# Altium footprint library OT Library.PcbLib: 396 footprints (part 23 of 25)
Each footprint in its own frame and in the unit in brackets; x right, y up, seen from the top. Pads: shape width x height; smd on the part's side, far side on the other; paste and mask are expansions set on the pad; w line width, h text height; cw(c..) or ccw(c..) is an arc to the next point about the centre after c.
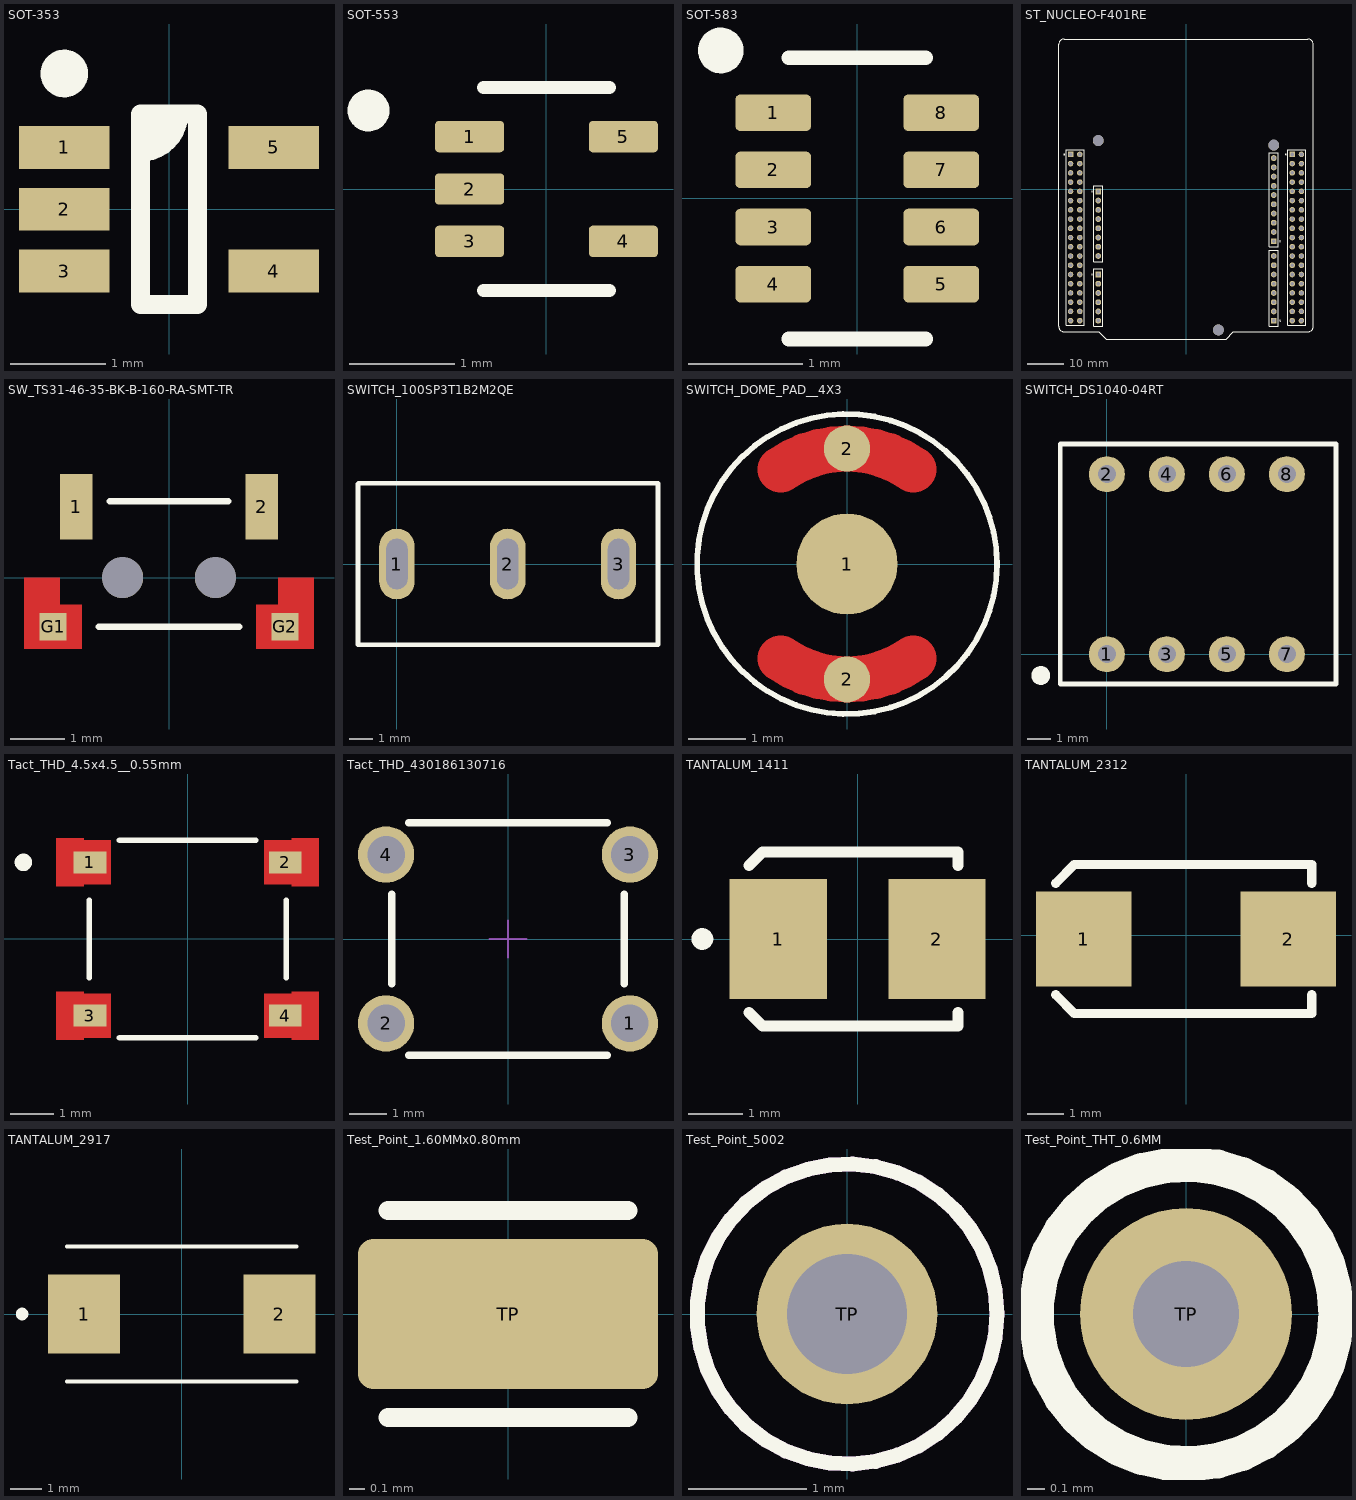
[diagram p22: the footprints below, top view; thin cyan lines are the x and y axes]

## SOT-353 [mm] "5-TSSOP, SC-70-5"
height 1.1
pads (5):
  rect 0.95x0.45 smd: 1(-1.1,0.65) 2(-1.1,0) 3(-1.1,-0.65) 4(1.1,-0.65) 5(1.1,0.65)
Top Overlay:
  circle w0.25: c-1.1,1.425 r0.125
  region: -0.3,1 -0.3,0.592 -0.144,0.623 -0.012,0.712 0.077,0.844 0.108,1 0.1,1
  lines w0.2: -0.3,0.6 ccw(c-0.3,1) 0.1,1 ; -0.3,-1 0.3,-1 0.3,1 -0.3,1 -0.3,-1
3D body: height 1.1, standoff 0, extent -1.06,-1 1.061,1

## SOT-553 [mm]
pads (5):
  rrect25% 0.66x0.3 smd: 1(-0.735,0.5) 2(-0.735,0) 3(-0.735,-0.5) 4(0.735,-0.5) 5(0.735,0.5)
Top Overlay:
  circle w0.2: c-1.7,0.75 r0.1
  lines w0.127: -0.6,-0.97 0.6,-0.97 ; -0.6,0.97 0.6,0.97
3D body: height 0.6, standoff 0, extent -0.8,-0.8 0.8,0.8

## SOT-583 [mm]
height 0.6
pads (8):
  rrect25% 0.66x0.32 smd mask+0: 1(-0.735,0.75) 2(-0.735,0.25) 3(-0.735,-0.25) 4(-0.735,-0.75) 5(0.735,-0.75) 6(0.735,-0.25) 7(0.735,0.25) 8(0.735,0.75)
Top Overlay:
  circle w0.2: c-1.194,1.295 r0.1
  lines w0.127: -0.6,-1.23 0.6,-1.23 ; -0.6,1.23 0.6,1.23
Top Solder:
  region: 1.115,0.54 0.355,0.54 0.355,0.96 1.115,0.96
  region: 1.115,0.04 0.355,0.04 0.355,0.46 1.115,0.46
  region: 1.115,-0.46 0.355,-0.46 0.355,-0.04 1.115,-0.04
  region: 1.115,-0.96 0.355,-0.96 0.355,-0.54 1.115,-0.54
  region: -0.355,-0.96 -1.115,-0.96 -1.115,-0.54 -0.355,-0.54
  region: -0.355,-0.46 -1.115,-0.46 -1.115,-0.04 -0.355,-0.04
  region: -0.355,0.04 -1.115,0.04 -1.115,0.46 -0.355,0.46
  region: -0.355,0.54 -1.115,0.54 -1.115,0.96 -0.355,0.96
3D body: height 0.6, standoff 0, extent -0.8,-1.05 0.8,1.05

## ST_NUCLEO-F401RE [mm]
pads (111):
  rect 1.605x1.605 / inner round 1.605 / far side rect 1.605x1.605 hole 1.07: 5_1(24.13,-14.37) 6_1(-24.13,-0.65) 8_1(-24.13,-23.51) 9_1(24.13,-36.21)
  round 1.605 hole 1.07: 5_2(24.13,-11.83) 5_3(24.13,-9.29) 5_4(24.13,-6.75) 5_5(24.13,-4.21) 5_6(24.13,-1.67) 5_7(24.13,0.87) 5_8(24.13,3.41) 5_9(24.13,5.95) 5_10(24.13,8.49) 6_2(-24.13,-3.19) 6_3(-24.13,-5.73) 6_4(-24.13,-8.27) 6_5(-24.13,-10.81) 6_6(-24.13,-13.35) 6_7(-24.13,-15.89) 6_8(-24.13,-18.43) 8_2(-24.13,-26.05) 8_3(-24.13,-28.59) 8_4(-24.13,-31.13) 8_5(-24.13,-33.67) 8_6(-24.13,-36.21) 9_2(24.13,-33.67) 9_3(24.13,-31.13) 9_4(24.13,-28.59) 9_5(24.13,-26.05) 9_6(24.13,-23.51) 9_7(24.13,-20.97) 9_8(24.13,-18.43)
  rect 1.53x1.53 / inner round 1.53 / far side rect 1.53x1.53 hole 1.02: 7_1(-31.75,9.51) 10_1(29.21,9.51)
  round 1.53 hole 1.02: 7_2(-29.21,9.51) 7_3(-31.75,6.97) 7_4(-29.21,6.97) 7_5(-31.75,4.43) 7_6(-29.21,4.43) 7_7(-31.75,1.89) 7_8(-29.21,1.89) 7_9(-31.75,-0.65) 7_10(-29.21,-0.65) 7_11(-31.75,-3.19) 7_12(-29.21,-3.19) 7_13(-31.75,-5.73) 7_14(-29.21,-5.73) 7_15(-31.75,-8.27) 7_16(-29.21,-8.27) 7_17(-31.75,-10.81) 7_18(-29.21,-10.81) 7_19(-31.75,-13.35) 7_20(-29.21,-13.35) 7_21(-31.75,-15.89) 7_22(-29.21,-15.89) 7_23(-31.75,-18.43) 7_24(-29.21,-18.43) 7_25(-31.75,-20.97) 7_26(-29.21,-20.97) 7_27(-31.75,-23.51) 7_28(-29.21,-23.51) 7_29(-31.75,-26.05) 7_30(-29.21,-26.05) 7_31(-31.75,-28.59) 7_32(-29.21,-28.59) 7_33(-31.75,-31.13) 7_34(-29.21,-31.13) 7_35(-31.75,-33.67) 7_36(-29.21,-33.67) 7_37(-31.75,-36.21) 7_38(-29.21,-36.21) 10_2(31.75,9.51) 10_3(29.21,6.97) 10_4(31.75,6.97) 10_5(29.21,4.43) 10_6(31.75,4.43) 10_7(29.21,1.89) 10_8(31.75,1.89) 10_9(29.21,-0.65) 10_10(31.75,-0.65) 10_11(29.21,-3.19) 10_12(31.75,-3.19) 10_13(29.21,-5.73) 10_14(31.75,-5.73) 10_15(29.21,-8.27) 10_16(31.75,-8.27) 10_17(29.21,-10.81) 10_18(31.75,-10.81) 10_19(29.21,-13.35) 10_20(31.75,-13.35) 10_21(29.21,-15.89) 10_22(31.75,-15.89) 10_23(29.21,-18.43) 10_24(31.75,-18.43) 10_25(29.21,-20.97) 10_26(31.75,-20.97) 10_27(29.21,-23.51) 10_28(31.75,-23.51) 10_29(29.21,-26.05) 10_30(31.75,-26.05) 10_31(29.21,-28.59) 10_32(31.75,-28.59) 10_33(29.21,-31.13) 10_34(31.75,-31.13) 10_35(29.21,-33.67) 10_36(31.75,-33.67) 10_37(29.21,-36.21) 10_38(31.75,-36.21)
  round 3 hole 3 unplated: ""(-24.13,13.32) ""(8.89,-38.75) ""(24.13,12.05)
Top Overlay:
  circle w0.2: c27.46,9.51 r0.1
  circle w0.2: c-33.5,9.51 r0.1
  circle w0.2: c25.88,-14.37 r0.1
  circle w0.2: c-25.88,-23.51 r0.1
  circle w0.2: c25.88,-36.21 r0.1
  circle w0.2: c-25.88,-0.65 r0.1
  lines w0.127: -35,-37.75 ccw(c-33.5,-37.75) -33.5,-39.25 -24,-39.25 -22,-41.25 11,-41.25 13,-39.25 33.5,-39.25 ccw(c33.5,-37.75) 35,-37.75 35,39.75 ccw(c33.5,39.75) 33.5,41.25 -33.5,41.25 ccw(c-33.5,39.75) -35,39.75 -35,-37.75 ; -32.98,-37.48 -27.98,-37.48 -27.98,10.78 -32.98,10.78 -32.98,-37.48 ; -25.38,-37.73 -22.88,-37.73 -22.88,-21.99 -25.38,-21.99 -25.38,-37.73 ; -25.38,-19.95 -22.88,-19.95 -22.88,0.87 -25.38,0.87 -25.38,-19.95 ; 22.88,-37.73 25.38,-37.73 25.38,-16.91 22.88,-16.91 22.88,-37.73 ; 22.88,-15.89 25.38,-15.89 25.38,10.01 22.88,10.01 22.88,-15.89 ; 27.98,-37.48 32.98,-37.48 32.98,10.78 27.98,10.78 27.98,-37.48
3D body: height 12.28, standoff -8.42, extent -35,-41.25 35,42.7

## SW_TS31-46-35-BK-B-160-RA-SMT-TR [mm]
height 2
pads (6):
  rect 0.6x1.2 smd: 1(-1.7,1.3) 2(1.7,1.3)
  rect 0.5x0.5 smd paste-1 mask+0: G1(-2.125,-0.9) G2(2.125,-0.9)
  round 0.75 hole 0.75 unplated: ""(-0.85,0) ""(0.85,0)
Top Layer:
  region: 2.65,-1.3 1.6,-1.3 1.6,-0.5 2,-0.5 2,0 2.65,0
  region: -2,-0.5 -1.6,-0.5 -1.6,-1.3 -2.65,-1.3 -2.65,0 -2,0
Top Overlay:
  lines w0.127: -1.28,-0.9 1.28,-0.9 ; -1.08,1.4 1.08,1.4
Top Paste:
  region: 2.65,-1.3 1.6,-1.3 1.6,-0.5 2,-0.5 2,0 2.65,0
  region: -2,-0.5 -1.6,-0.5 -1.6,-1.3 -2.65,-1.3 -2.65,0 -2,0
Top Solder:
  region: 2.75,-1.4 1.5,-1.4 1.5,-0.4 1.9,-0.4 1.9,0.1 2.75,0.1
  region: -1.9,-0.4 -1.5,-0.4 -1.5,-1.4 -2.75,-1.4 -2.75,0.1 -1.9,0.1
3D body: height 1.8, standoff -0.4, extent -2.3,-2.083 2.3,1.604

## SWITCH_100SP3T1B2M2QE [mm]
pads (3):
  oval 1.5x3 hole 0.9 slot 2.15 at 90 deg: 1(0,0) 2(4.7,0) 3(9.4,0)
Top Overlay:
  lines w0.2: -1.651,3.404 -1.651,-3.429 11.074,-3.429 11.074,3.429 -1.626,3.429
3D body: height 27.94, standoff -6.6, extent -1.65,-3.43 11.05,3.43

## SWITCH_DOME_PAD__4X3 [mm]
pads (3):
  round 1.75 smd paste-10 mask+0.102: 1(0,0)
  round 0.8 smd paste-10 mask-10: 2(0,-2) 2(0,2)
Top Layer:
  lines w0.8: -1.147,-1.638 ccw(c0,0) 1.147,-1.638 ; -1.147,1.638 cw(c0,0) 1.147,1.638
Top Overlay:
  circle w0.1: c0,0 r2.6
Top Solder:
  lines w1: -1.162,-1.627 ccw(c0,0) 1.109,-1.664 ; -1.109,1.664 cw(c0,0) 1.162,1.627

## SWITCH_DS1040-04RT [mil]
pads (8):
  round 60 hole 30: 1(0,0) 2(0,300) 3(100,0) 4(100,300) 6(200,300) 7(300,0) 8(300,300)
  round 60 hole 30 mask+4: 5(200,0)
Top Overlay:
  circle w15.75: c-110.24,-35.43 r7.87
  lines w7.87: -77.87,-49.61 -77.87,350.39 381.89,350.39 381.89,-49.61 -77.87,-49.61
3D body: height 362.2, standoff -151.57, extent -78.74,-102.36 380.31,346.46

## Tact_THD_4.5x4.5__0.55mm [mm]
pads (4):
  rect 0.75x0.5 smd: 1(-2.23,1.75) 2(2.23,1.75) 3(-2.23,-1.75) 4(2.23,-1.75)
Top Layer:
  region: 2.375,1.25 1.75,1.25 1.75,2.25 2.375,2.25 2.375,2.3 3,2.3 3,1.2 2.375,1.2
  region: 2.375,-2.25 1.75,-2.25 1.75,-1.25 2.375,-1.25 2.375,-1.2 3,-1.2 3,-2.3 2.375,-2.3
  region: -2.375,-1.25 -1.75,-1.25 -1.75,-2.25 -2.375,-2.25 -2.375,-2.3 -3,-2.3 -3,-1.2 -2.375,-1.2
  region: -2.375,2.25 -1.75,2.25 -1.75,1.25 -2.375,1.25 -2.375,1.2 -3,1.2 -3,2.3 -2.375,2.3
Top Overlay:
  circle w0.2: c-3.75,1.75 r0.1
  lines w0.127: -2.25,-0.88 -2.25,0.88 ; -1.555,-2.25 1.555,-2.25 ; -1.555,2.25 1.555,2.25 ; 2.25,-0.88 2.25,0.88
Top Solder:
  region: -2.375,-1.25 -1.75,-1.25 -1.75,-2.25 -2.375,-2.25 -2.375,-2.3 -3,-2.3 -3,-1.2 -2.375,-1.2
  region: 2.375,-2.25 1.75,-2.25 1.75,-1.25 2.375,-1.25 2.375,-1.2 3,-1.2 3,-2.3 2.375,-2.3
  region: 2.375,1.25 1.75,1.25 1.75,2.25 2.375,2.25 2.375,2.3 3,2.3 3,1.2 2.375,1.2
  region: -2.375,2.25 -1.75,2.25 -1.75,1.25 -2.375,1.25 -2.375,1.2 -3,1.2 -3,2.3 -2.375,2.3
3D body: height 0.6, standoff 0, extent -2.375,-2.25 2.375,2.25

## Tact_THD_430186130716 [mm] "6x6mm Tact Switch, THT version"
height 4.3
pads (4):
  round 1.5 hole 1: 1(3.25,-2.25) 2(-3.25,-2.25) 3(3.25,2.25) 4(-3.25,2.25)
Top Overlay:
  lines w0.2: -3.1,-1.2 -3.1,1.2 ; -2.65,-3.1 2.65,-3.1 ; -2.65,3.1 2.65,3.1 ; 3.1,-1.2 3.1,1.2
Mechanical 17:
  lines w0.05: -0.5,0 0.5,0 ; 0,-0.5 0,0.5
Test Points Top:
  text ".Designator" at -7.498,-0.5 h1.5
3D body: height 13.05, standoff -3.45, extent -3.947,-3.1 3.947,3.1

## TANTALUM_1411 [mm] "0.138\" L x 0.110\" W (3.50mm x 2.80mm)"
height 2.1
pads (2):
  rect 1.79x2.21 smd: 1(-1.46,0) 2(1.46,0)
Top Overlay:
  circle w0.2: c-2.855,0 r0.1
  lines w0.2: -2,-1.35 -1.75,-1.6 1.85,-1.6 1.85,-1.35 ; -2,1.35 -1.75,1.6 1.85,1.6 1.85,1.35
3D body: height 2.1, standoff 0, extent -1.75,-1.4 1.75,1.4

## TANTALUM_2312 [mm] "Tantalium Capacitors - 6032 - Case C"
height 5.5
pads (2):
  rect 2.6x2.6 smd: 1(-2.794,-0.1) 2(2.794,-0.1)
Top Overlay:
  lines w0.254: -3.556,-1.624 -3.048,-2.132 3.429,-2.132 3.429,-1.624 ; -3.556,1.424 -3.048,1.932 3.429,1.932 3.429,1.424
3D body: height 2.8, standoff 0, extent -3.15,-1.85 3.15,1.65

## TANTALUM_2917 [mm] "0.287\" L x 0.169\" W (7.30mm x 4.30mm)"
height 3.1
pads (2):
  rect 2.3x2.52 smd: 1(-3.11,0) 2(3.11,0)
Top Overlay:
  circle w0.2: c-5.08,0 r0.1
  lines w0.127: -3.65,-2.15 3.65,-2.15 ; -3.65,2.15 3.65,2.15
3D body: height 3.1, standoff 0, extent -3.65,-2.15 3.65,2.15

## Test_Point_1.60MMx0.80mm [mm] "0.063\" L x 0.032\" W (1.60mm x 0.80mm)"
height 1.15
pads (1):
  rrect20% 2x1 smd: TP(0,0)
Top Overlay:
  lines w0.127: -0.8,-0.69 0.8,-0.69 ; -0.8,0.69 0.8,0.69
3D body: height 1.15, standoff 0, extent -0.8,-0.45 0.8,0.45

## Test_Point_5002 [mm] "0.040\" (1.02mm)"
height 4.57
pads (1):
  round 1.53 hole 1.02: TP(0,0)
Top Overlay:
  circle w0.127: c0,0 r1.27
3D Top:
  circle w0.127: c0,0 r1.27
3D body: height 4.57, standoff -3.05, extent -1.27,-1.27 1.27,1.27

## Test_Point_THT_0.6MM [mm] "0.6mm"
pads (1):
  round 1.2 hole 0.6: TP(0,0)
Top Overlay:
  circle w0.2: c0,0 r0.85